# Altium schematic symbol library 724452_RPL-HX_Mobile_AEP_Rev0p91_Library.SchLib: 162 symbols (part 3 of 5) (continued)
## C_SLG7NT44244 (continued)

## C_SLG7NT44603
designator ?  (value not drawn)
CDS_LMAN_SYM_OUTLINE: -500,550,500,-550; ROOM: NONE; OriginalSymbolOrigin: (-550,550); FP_TECH: ?; IP: ?; MATERIAL: ?; PACK_TYPE: ?; PART_NUMBER: ?; VARIANT: ?
pins: 1 VDD (power) hidden to VDD, 2 BC_ACOK_IN (in), 3 DPWROK (out), 4 BC_ACOK_DSW (out), 5 SUS_VR_PWRGD (in), 6 V1 (io), 7 PWRBTN_N (in), 8 VCCST_PWRGD (out), 9 EC_RTC_WAKE_N (in), 10 V2 (io), 11 GND (in), 12 V3P3_DSW_VR_EN (out), 13 V3 (io), 14 EC_DS3 (in), 15 VBAT_MON (io), 16 RSMRST_PWRGD_N (out), 17 V3P3DSW_PWRGD (in), 18 ALL_SYS_PWRGD (out), 19 VCCINAUX_PG_DDR_V (in), 20 PCH_PWROK (out)

## C_SN74CBT3125
designator ?  (value not drawn)
CDS_LMAN_SYM_OUTLINE: -250,450,250,-450; ROOM: NONE; OriginalSymbolOrigin: (-300,450); FP_TECH: ?; IP: ?; MATERIAL: ?; PACK_TYPE: ?; PART_NUMBER: ?; VARIANT: ?
pins: 1 1OE_N (in), 2 1A (in), 3 1B (out), 4 2OE_N (in), 5 2A (in), 6 2B (out), 7 GND (in), 8 3B (out), 9 3A (in), 10 3OE_N (in), 11 4B (out), 12 4A (in), 13 4OE_N (in), 14 VCC (power), 15 THPAD (in)

## C_SN74CBTLV3257
designator ?  (value not drawn)
CDS_LMAN_SYM_OUTLINE: -200,450,200,-450; ROOM: NONE; OriginalSymbolOrigin: (-250,450); FP_TECH: ?; IP: ?; MATERIAL: ?; PACK_TYPE: ?; PART_NUMBER: ?; VARIANT: ?
pins: 1 S (in), 2 1B1 (io), 3 1B2 (io), 4 1A (io), 5 2B1 (io), 6 2B2 (io), 7 2A (io), 8 GND (in), 9 3A (io), 10 3B2 (io), 11 3B1 (io), 12 4A (io), 13 4B2 (io), 14 4B1 (io), 15 OE_N (in), 16 VCC (power) hidden to VCC

## C_SW_SPST_PB_4P
designator ?  (value not drawn)
CDS_LMAN_SYM_OUTLINE: -150,200,150,-200; ROOM: NONE; OriginalSymbolOrigin: (-175,200); FP_TECH: ?; IP: ?; MATERIAL: ?; PACK_TYPE: ?; PART_NUMBER: ?; VARIANT: ?
pins: 1 (io), 2 (io), 3 (io), 4 (io)

## C_THERMISTOR
designator ?, comment ?
CDS_LMAN_SYM_OUTLINE: -50,50,50,-50; ROOM: NONE; OriginalSymbolOrigin: (-75,50); FP_TECH: ?; IP: ?; MATERIAL: ?; PACK_TYPE: ?; PART_NUMBER: ?; TOLERANCE: ?; VARIANT: ?; WATTAGE: ?
pins: 1 A (io), 2 B (io)

## C_TLV62585
designator ?  (value not drawn)
CDS_LMAN_SYM_OUTLINE: -200,200,200,-200; ROOM: NONE; OriginalSymbolOrigin: (-225,200); FP_TECH: ?; IP: ?; MATERIAL: ?; PACK_TYPE: ?; PART_NUMBER: ?; VARIANT: ?
pins: 1 GND (in), 2 SW (out), 3 VIN (power), 4 EN (in), 5 FB (io), 6 NC (io)

## C_TS3A27518E
designator ?  (value not drawn)
6 Circuit IC Switch 2:1 6.2Ohm 24-WQFN (4x4); Manufacturer Part Number: TS3A27518ERTWR; Case/Package: 24-WFQFN
pins: 1 COM1, 2 GND, 3 COM2, 4 COM3, 5 VCC, 6 COM4, 7 COM5, 8 NO1, 9 COM6, 10 NO2, 11 IN2, 12 NO3, 13 NO6, 14 NO4, 15 NO5, 16 NC5, 17 EN_N, 18 NC4, 19 NC6, 20 NC3, 21 IN1, 22 NC2, 23 NC1, 24 NC, 25 THPAD

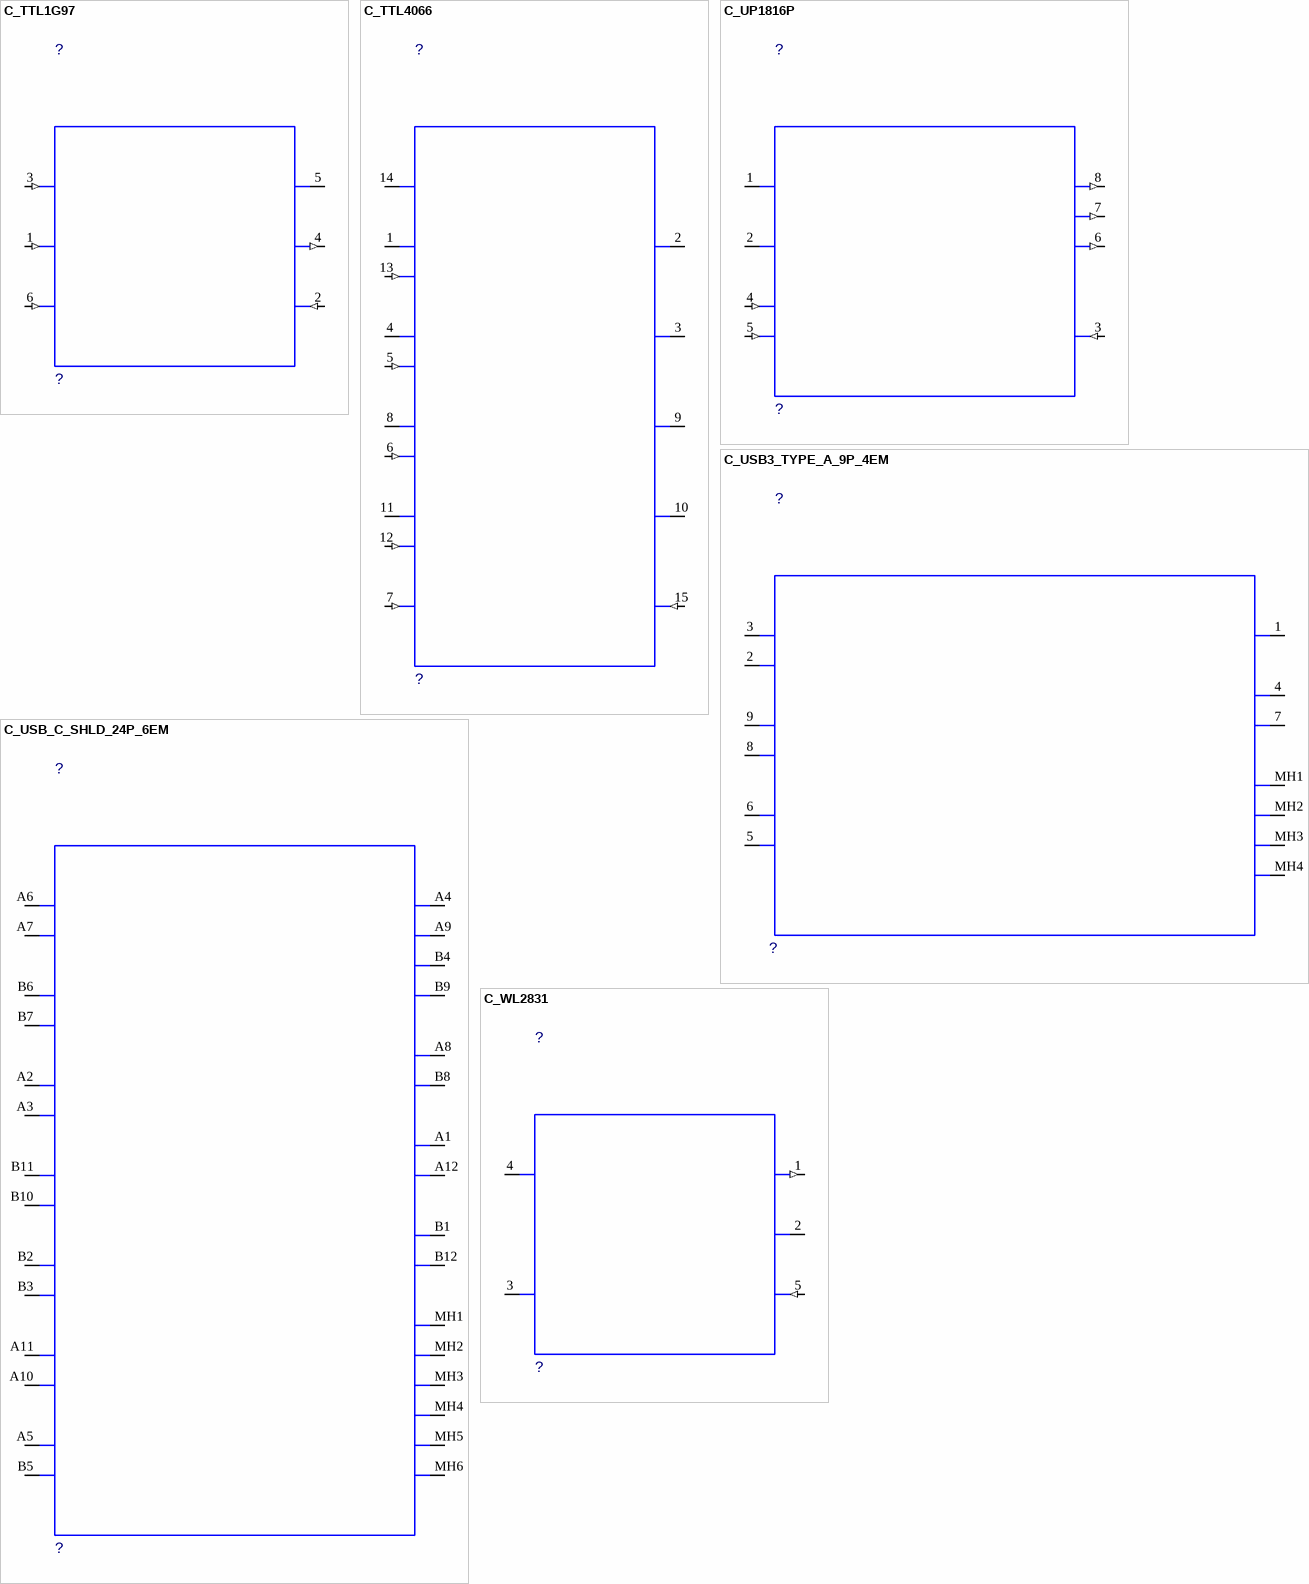
[diagram p25: symbols C_TTL1G97 to C_WL2831]

## C_TTL1G97
designator ?  (value not drawn)
CDS_LMAN_SYM_OUTLINE: -200,200,200,-200; ROOM: NONE; OriginalSymbolOrigin: (-225,200); FP_TECH: ?; IP: ?; MATERIAL: ?; PACK_TYPE: ?; PART_NUMBER: ?; VARIANT: ?
pins: 1 B (in), 2 GND (in), 3 A (in), 4 Y (out), 5 VCC (power), 6 C (in)

## C_TTL4066
designator ?  (value not drawn)
CDS_LMAN_SYM_OUTLINE: -200,450,200,-450; ROOM: NONE; OriginalSymbolOrigin: (-225,450); FP_TECH: ?; IP: ?; MATERIAL: ?; PACK_TYPE: ?; PART_NUMBER: ?; VARIANT: ?
pins: 1 1Y (io), 2 1Z (io), 3 2Z (io), 4 2Y (io), 5 2E (in), 6 3E (in), 7 GND (in), 8 3Y (io), 9 3Z (io), 10 4Z (io), 11 4Y (io), 12 4E (in), 13 1E (in), 14 VCC (power), 15 GND_TPD (in)

## C_UP1816P
designator ?  (value not drawn)
CDS_LMAN_SYM_OUTLINE: -250,200,250,-250; ROOM: NONE; OriginalSymbolOrigin: (-275,200); FP_TECH: ?; IP: ?; MATERIAL: ?; PACK_TYPE: ?; PART_NUMBER: ?; VARIANT: ?
pins: 1 VCC (power), 2 BUS_SEL (io), 3 GND (in), 4 SDA (in), 5 SCL (in), 6 OUT3 (out), 7 OUT2 (out), 8 OUT1 (out)

## C_USB3_TYPE_A_9P_4EM
designator ?  (value not drawn)
CDS_LMAN_SYM_OUTLINE: -400,300,400,-300; ROOM: NONE; OriginalSymbolOrigin: (-425,300); FP_TECH: ?; IP: ?; MATERIAL: ?; PACK_TYPE: ?; PART_NUMBER: ?; VARIANT: ?
pins: 1 VBUS_POWER (power), 2 D_DN (io), 3 D_DP (io), 4 GND_POWER_RETURN (io), 5 SSRX_DN (io), 6 SSRX_DP (io), 7 GND (io), 8 SSTX_DN (io), 9 SSTX_DP (io), MH1 (io), MH2 (io), MH3 (io), MH4 (io)

## C_USB_C_SHLD_24P_6EM
designator ?  (value not drawn)
CDS_LMAN_SYM_OUTLINE: -300,600,300,-550; ROOM: NONE; OriginalSymbolOrigin: (-325,600); FP_TECH: ?; IP: ?; MATERIAL: ?; PACK_TYPE: ?; PART_NUMBER: ?; VARIANT: ?
pins: A1 GND_A1 (io), A2 SSTXP1 (io), A3 SSTXN1 (io), A4 VBUS_A4 (power), A5 CC1 (io), A6 DP1 (io), A7 DN1 (io), A8 SBU1 (io), A9 VBUS_A9 (power), A10 SSRXN2 (io), A11 SSRXP2 (io), A12 GND_A12 (io), B1 GND_B1 (io), B2 SSTXP2 (io), B3 SSTXN2 (io), B4 VBUS_B4 (power), B5 CC2 (io), B6 DP2 (io), B7 DN2 (io), B8 SBU2 (io), B9 VBUS_B9 (power), B10 SSRXN1 (io), B11 SSRXP1 (io), B12 GND_B12 (io), MH1 (io), MH2 (io), MH3 (io), MH4 (io), MH5 (io), MH6 (io)

## C_WL2831
designator ?  (value not drawn)
CDS_LMAN_SYM_OUTLINE: -200,200,200,-200; ROOM: NONE; OriginalSymbolOrigin: (-225,200); FP_TECH: ?; IP: ?; MATERIAL: ?; PACK_TYPE: ?; PART_NUMBER: ?; VARIANT: ?
pins: 1 VOUT (out), 2 BIAS (io), 3 EN (io), 4 VIN (power), 5 GND_TPD (in)

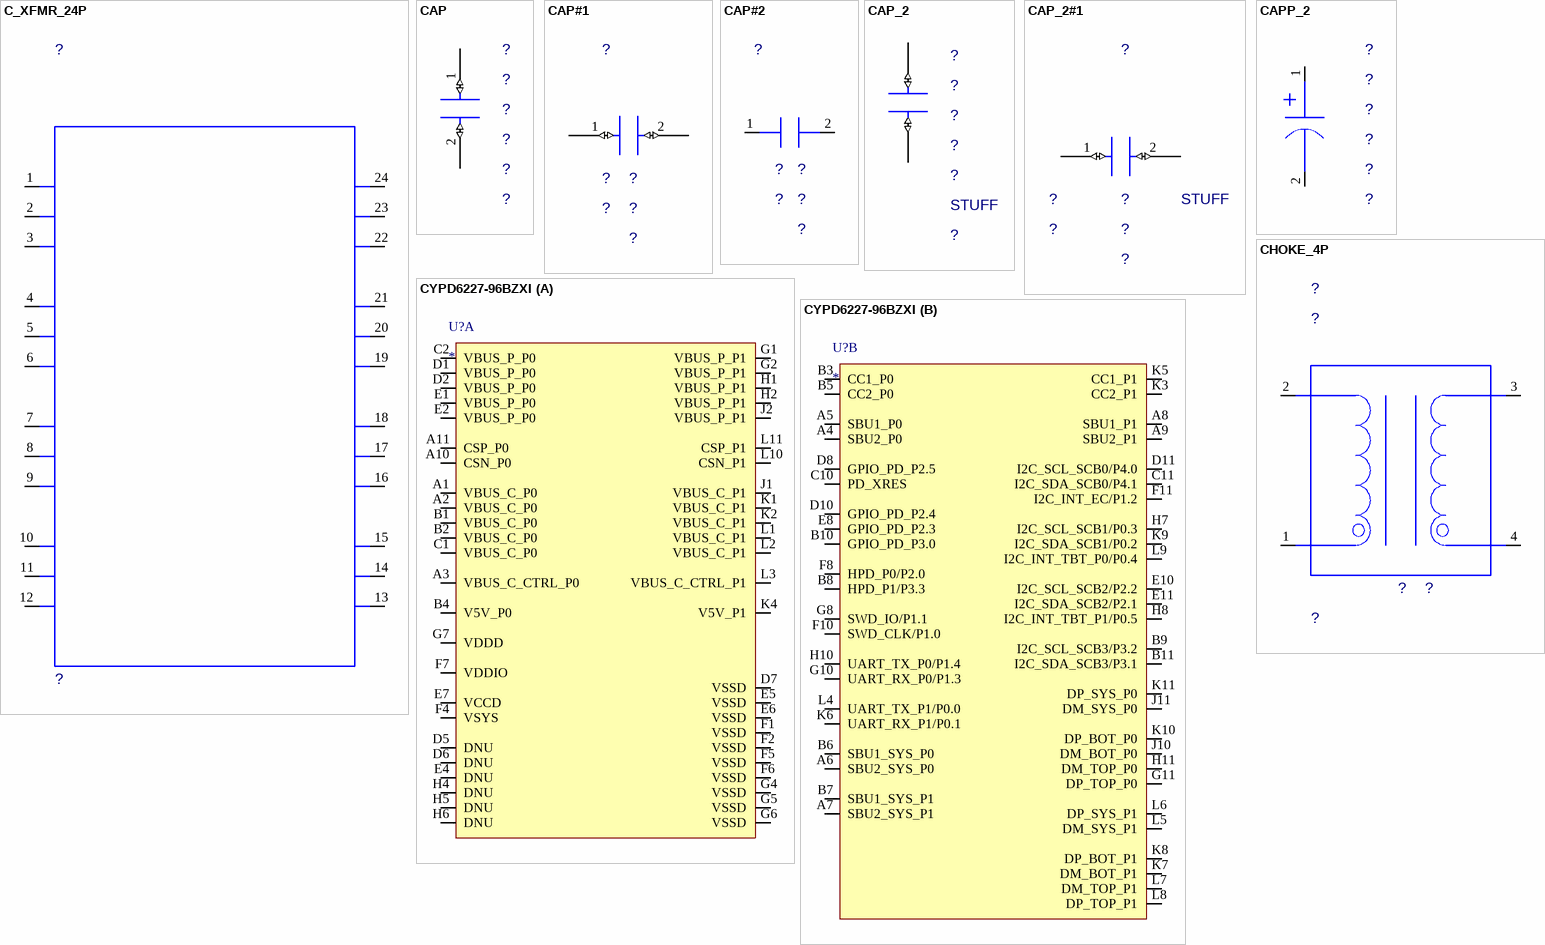
[diagram p26: symbols C_XFMR_24P to CYPD6227-96BZXI]

## C_XFMR_24P
designator ?  (value not drawn)
CDS_LMAN_SYM_OUTLINE: -250,450,250,-450; ROOM: NONE; OriginalSymbolOrigin: (-275,450); FP_TECH: ?; IP: ?; MATERIAL: ?; PACK_TYPE: ?; PART_NUMBER: ?; VARIANT: ?
pins: 1 TCT1 (io), 2 TD1P (io), 3 TD1N (io), 4 TCT2 (io), 5 TD2P (io), 6 TD2N (io), 7 TCT3 (io), 8 TD3P (io), 9 TD3N (io), 10 TCT4 (io), 11 TD4P (io), 12 TD4N (io), 13 MX4N (io), 14 MX4P (io), 15 MCT4 (io), 16 MX3N (io), 17 MX3P (io), 18 MCT3 (io), 19 MX2N (io), 20 MX2P (io), 21 MCT2 (io), 22 MX1N (io), 23 MX1P (io), 24 MCT1 (io)

## CAP
designator ?, comment ?
OriginalSymbolOrigin: (-50,25); MATERIAL: ?; PACK_TYPE: ?; PART_NUMBER: ?; TOLERANCE: ?; VOLTAGE: ?
pins: 1 A (io), 2 B (io)

## CAP#1
designator ?, comment ?
OriginalSymbolOrigin: (-25,50); MATERIAL: ?; PACK_TYPE: ?; PART_NUMBER: ?; TOLERANCE: ?; VOLTAGE: ?
pins: 1 A (io), 2 B (io)

## CAP#2
designator ?, comment ?
OriginalSymbolOrigin: (-75,25); MATERIAL: ?; PACK_TYPE: ?; PART_NUMBER: ?; TOLERANCE: ?; VOLTAGE: ?
pins: 1 A (io), 2 B (io)

## CAP_2
designator ?, comment ?  BOM_USE: STUFF
CDS_LMAN_SYM_OUTLINE: -50,50,50,-50; ROOM: NONE; OriginalSymbolOrigin: (-50,25); FP_TECH: ?; IP: ?; MATERIAL: ?; PACK_TYPE: ?; PART_NUMBER: ?; TOLERANCE: ?; VARIANT: ?; VOLTAGE: ?
pins: 1 A (io), 2 B (io)

## CAP_2#1
designator ?, comment ?  BOM_USE: STUFF
CDS_LMAN_SYM_OUTLINE: -50,50,50,-50; ROOM: NONE; OriginalSymbolOrigin: (-25,50); FP_TECH: ?; IP: ?; MATERIAL: ?; PACK_TYPE: ?; PART_NUMBER: ?; TOLERANCE: ?; VARIANT: ?; VOLTAGE: ?
pins: 1 A (io), 2 B (io)

## CAPP_2
designator ?, comment ?
BOM_USE: STUFF; CDS_LMAN_SYM_OUTLINE: -50,100,50,-50; ROOM: NONE; OriginalSymbolOrigin: (-50,75); FP_TECH: ?; IP: ?; MATERIAL: ?; PACK_TYPE: ?; PART_NUMBER: ?; TOLERANCE: ?; VARIANT: ?; VOLTAGE: ?
pins: 1 A (io), 2 B (io)

## CHOKE_4P
designator ?, comment ?
CDS_LMAN_SYM_OUTLINE: -150,200,150,-150; OriginalSymbolOrigin: (-175,200); CURRENT: ?; MATERIAL: ?; PACK_TYPE: ?; PART_NUMBER: ?; TOLERANCE: ?
pins: 1 PIN1 (io), 2 PIN2 (io), 3 PIN3 (io), 4 PIN4 (io)

## CYPD6227-96BZXI
designator U?
part A pins: A1 VBUS_C_P0, A2 VBUS_C_P0, A3 VBUS_C_CTRL_P0, A10 CSN_P0, A11 CSP_P0, B1 VBUS_C_P0, B2 VBUS_C_P0, B4 V5V_P0, C1 VBUS_C_P0, C2 VBUS_P_P0, D1 VBUS_P_P0, D2 VBUS_P_P0, D5 DNU, D6 DNU, D7 VSSD, E1 VBUS_P_P0, E2 VBUS_P_P0, E4 DNU, E5 VSSD, E6 VSSD, E7 VCCD, F1 VSSD, F2 VSSD, F4 VSYS, F5 VSSD, F6 VSSD, F7 VDDIO, G1 VBUS_P_P1, G2 VBUS_P_P1, G4 VSSD, G5 VSSD, G6 VSSD, G7 VDDD, H1 VBUS_P_P1, H2 VBUS_P_P1, H4 DNU, H5 DNU, H6 DNU, J1 VBUS_C_P1, J2 VBUS_P_P1, K1 VBUS_C_P1, K2 VBUS_C_P1, K4 V5V_P1, L1 VBUS_C_P1, L2 VBUS_C_P1, L3 VBUS_C_CTRL_P1, L10 CSN_P1, L11 CSP_P1
part B pins: A4 SBU2_P0, A5 SBU1_P0, A6 SBU2_SYS_P0, A7 SBU2_SYS_P1, A8 SBU1_P1, A9 SBU2_P1, B3 CC1_P0, B5 CC2_P0, B6 SBU1_SYS_P0, B7 SBU1_SYS_P1, B8 HPD_P1/P3.3, B9 I2C_SCL_SCB3/P3.2, B10 GPIO_PD_P3.0, B11 I2C_SDA_SCB3/P3.1, C10 PD_XRES, C11 I2C_SDA_SCB0/P4.1, D8 GPIO_PD_P2.5, D10 GPIO_PD_P2.4, D11 I2C_SCL_SCB0/P4.0, E8 GPIO_PD_P2.3, E10 I2C_SCL_SCB2/P2.2, E11 I2C_SDA_SCB2/P2.1, F8 HPD_P0/P2.0, F10 SWD_CLK/P1.0, F11 I2C_INT_EC/P1.2, G8 SWD_IO/P1.1, G10 UART_RX_P0/P1.3, G11 DP_TOP_P0, H7 I2C_SCL_SCB1/P0.3, H8 I2C_INT_TBT_P1/P0.5, H10 UART_TX_P0/P1.4, H11 DM_TOP_P0, J10 DM_BOT_P0, J11 DM_SYS_P0, K3 CC2_P1, K5 CC1_P1, K6 UART_RX_P1/P0.1, K7 DM_BOT_P1, K8 DP_BOT_P1, K9 I2C_SDA_SCB1/P0.2, K10 DP_BOT_P0, K11 DP_SYS_P0, L4 UART_TX_P1/P0.0, L5 DM_SYS_P1, L6 DP_SYS_P1, L7 DM_TOP_P1, L8 DP_TOP_P1, L9 I2C_INT_TBT_P0/P0.4

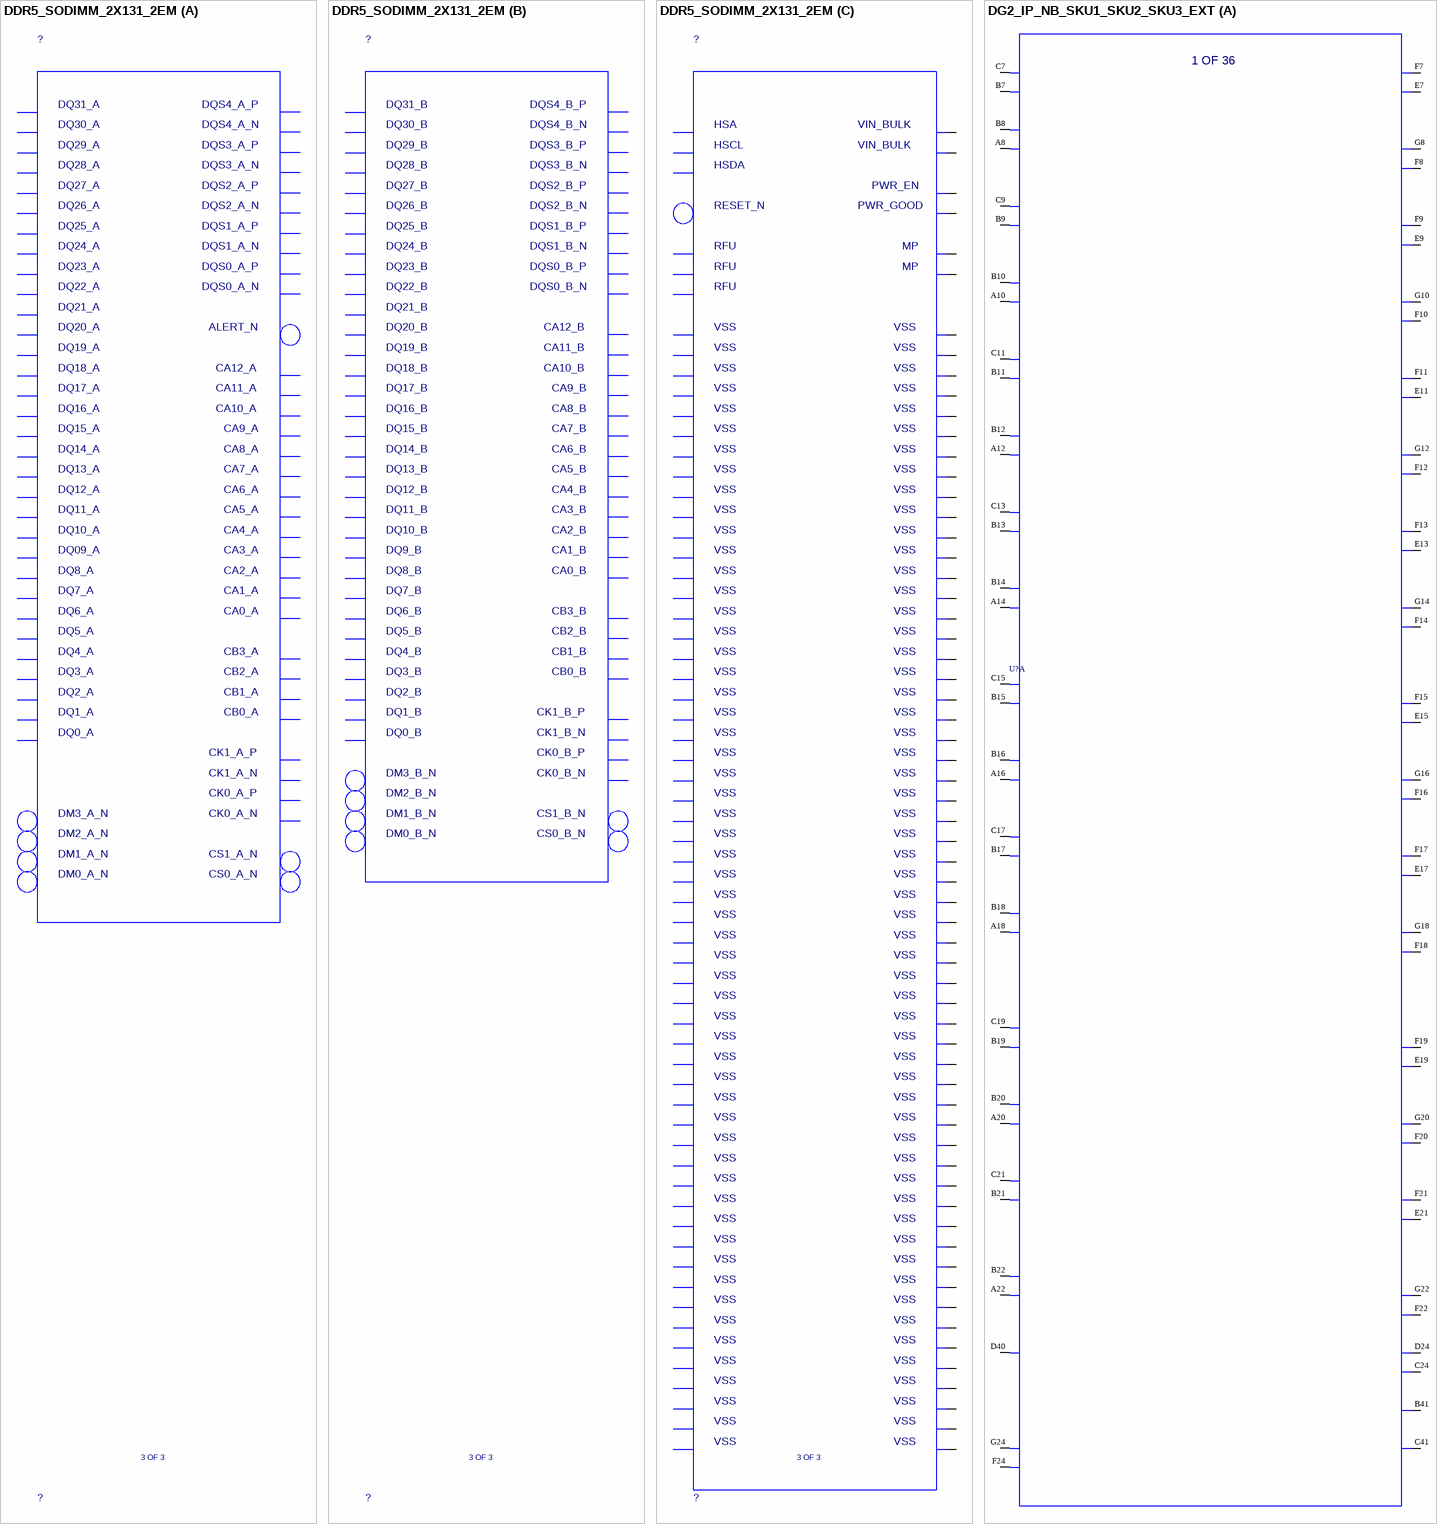
[diagram p27: symbols DDR5_SODIMM_2X131_2EM to DG2_IP_NB_SKU1_SKU2_SKU3_EXT]

## DDR5_SODIMM_2X131_2EM
designator ?  PART_SYM_NUM: 3 OF 3  (hidden comment: DDR5_SODIMM_2X131_2EM)
BOM_USE: STUFF; ROOM: NONE; OriginalSymbolOrigin: (-350,1750); FP_TECH: ?; IP: ?; MATERIAL: ?; PACK_TYPE: ?; PART_NUMBER: ?; VARIANT: ?
part A pins: 11 DQ0_A (io), 12 DQ1_A (io), 15 DQ2_A (io), 16 DQ3_A (io), 19 DM0_A_N (io), 20 DQS0_AN (io), 22 DQS0_A_P (io), 23 DQ4_A (io), 26 DQ5_A (io), 27 DQ6_A (io), 30 DQ7_A (io), 31 DQ8_A (io), 34 DQ09_A (io), 35 DQ10_A (io), 38 DQ11_A (io), 39 DQS1_AN (io), 41 DQS1_A_P (io), 42 DM1_A_N (io), 45 DQ12_A (io), 46 DQ13_A (io), 49 DQ14_A (io), 50 DQ15_A (io), 53 DQ16_A (io), 54 DQ17_A (io), 57 DQ18_A (io), 58 DQ19_A (io), 61 DM2_A_N (io), 62 DQS2_AN (io), 64 DQS2_A_P (io), 65 DQ20_A (io), 68 DQ21_A (io), 69 DQ22_A (io), 72 DQ23_A (io), 73 DQ24_A (io), 76 DQ25_A (io), 77 DQ26_A (io), 80 DQ27_A (io), 81 DQS3_AN (io), 83 DQS3_A_P (io), 84 DM3_A_N (io), 87 DQ28_A (io), 88 DQ29_A (io), 91 DQ30_A (io), 92 DQ31_A (io), 95 CB0_A (io), 96 CB1_A (io), 99 CB2_A (io), 100 DQS4_AN (io), 102 DQS4_A_P (io), 103 CB3_A (io), 106 CS0_A_N (io), 107 CA0_A (io), 108 ALERT_N (io), 109 CA1_A (io), 110 CS1_A_N (io), 113 CA2_A (io), 114 CA3_A (io), 115 CA4_A (io), 116 CA5_A (io), 119 CA6_A (io), 120 CA7_A (io), 121 CA8_A (io), 122 CA9_A (io), 125 CA10_A (io), 126 CA11_A (io), 127 CA12_A (io), 131 CK0_A_P (io), 132 CK1_A_P (io), 133 CK0_AN (io), 134 CK1_AN (io)
part B pins: 137 CK0_B_P (io), 138 CK1_B_P (io), 139 CK0_BN (io), 140 CK1_BN (io), 144 CA12_B (io), 145 CA11_B (io), 146 CA10_B (io), 149 CA9_B (io), 150 CA8_B (io), 151 CA7_B (io), 152 CA6_B (io), 155 CA5_B (io), 156 CA4_B (io), 157 CA3_B (io), 158 CA2_B (io), 161 CS0_B_N (io), 162 CA1_B (io), 164 CA0_B (io), 165 CS1_B_N (io), 168 CB0_B (io), 169 DQS4_BN (io), 171 DQS4_B_P (io), 172 CB1_B (io), 175 CB3_B (io), 176 CB2_B (io), 179 DQ0_B (io), 180 DQ1_B (io), 183 DQ2_B (io), 184 DQ3_B (io), 187 DM0_B_N (io), 188 DQS0_BN (io), 190 DQS0_B_P (io), 191 DQ4_B (io), 194 DQ5_B (io), 195 DQ6_B (io), 198 DQ7_B (io), 199 DQ8_B (io), 202 DQ9_B (io), 203 DQ10_B (io), 206 DQ11_B (io), 207 DQS1_BN (io), 209 DQS1_B_P (io), 210 DM1_B_N (io), 213 DQ12_B (io), 214 DQ13_B (io), 217 DQ14_B (io), 218 DQ15_B (io), 221 DQ16_B (io), 222 DQ17_B (io), 225 DQ18_B (io), 226 DQ19_B (io), 229 DM2_B_N (io), 230 DQS2_BN (io), 232 DQS2_B_P (io), 233 DQ20_B (io), 236 DQ21_B (io), 237 DQ22_B (io), 240 DQ23_B (io), 241 DQ24_B (io), 244 DQ25_B (io), 245 DQ26_B (io), 248 DQ27_B (io), 249 DQS3_BN (io), 251 DQS3_B_P (io), 252 DM3_B_N (io), 255 DQ28_B (io), 256 DQ29_B (io), 259 DQ30_B (io), 260 DQ31_B (io)
part C pins: 1 VIN_BULK_1 (io), 2 HSA (io), 3 VIN_BULK_3 (io), 4 HSCL (io), 5 RFU_5 (io), 6 HSDA (io), 7 PWR_GOOD (io), 8 PWR_EN (io), 9 VSS_9 (io), 10 VSS_10 (io), 13 VSS_13 (io), 14 VSS_14 (io), 17 VSS_17 (io), 18 VSS_18 (io), 21 VSS_21 (io), 24 VSS_24 (io), 25 VSS_25 (io), 28 VSS_28 (io), 29 VSS_29 (io), 32 VSS_32 (io), 33 VSS_33 (io), 36 VSS_36 (io), 37 VSS_37 (io), 40 VSS_40 (io), 43 VSS_43 (io), 44 VSS_44 (io), 47 VSS_47 (io), 48 VSS_48 (io), 51 VSS_51 (io), 52 VSS_52 (io), 55 VSS_55 (io), 56 VSS_56 (io), 59 VSS_59 (io), 60 VSS_60 (io), 63 VSS_63 (io), 66 VSS_66 (io), 67 VSS_67 (io), 70 VSS_70 (io), 71 VSS_71 (io), 74 VSS_74 (io), 75 VSS_75 (io), 78 VSS_78 (io), 79 VSS_79 (io), 82 VSS_82 (io), 85 VSS_85 (io), 86 VSS_86 (io), 89 VSS_89 (io), 90 VSS_90 (io), 93 VSS_93 (io), 94 VSS_94 (io), 97 VSS_97 (io), 98 VSS_98 (io), 101 VSS_101 (io), 104 VSS_104 (io), 105 VSS_105 (io), 111 VSS_111 (io), 112 VSS_112 (io), 117 VSS_117 (io), 118 VSS_118 (io), 123 VSS_123 (io), 124 VSS_124 (io), 128 RFU_128 (io), 129 VSS_129 (io), 130 VSS_130 (io), 135 VSS_135 (io), 136 VSS_136 (io), 141 VSS_141 (io), 142 VSS_142 (io), 143 RFU_143 (io), 147 VSS_147 (io), 148 VSS_148 (io), 153 VSS_153 (io), 154 VSS_154 (io), 159 VSS_159 (io), 160 VSS_160 (io), 163 RESET_N (io), 166 VSS_166 (io), 167 VSS_167 (io), 170 VSS_170 (io), 173 VSS_173 (io), 174 VSS_174 (io), 177 VSS_177 (io), 178 VSS_178 (io), 181 VSS_181 (io), 182 VSS_182 (io), 185 VSS_185 (io), 186 VSS_186 (io), 189 VSS_189 (io), 192 VSS_192 (io), 193 VSS_193 (io), 196 VSS_196 (io), 197 VSS_197 (io), 200 VSS_200 (io), 201 VSS_201 (io), 204 VSS_204 (io), 205 VSS_205 (io), 208 VSS_208 (io), 211 VSS_211 (io), 212 VSS_212 (io), 215 VSS_215 (io), 216 VSS_216 (io), 219 VSS_219 (io), 220 VSS_220 (io), 223 VSS_223 (io), 224 VSS_224 (io), 227 VSS_227 (io), 228 VSS_228 (io), 231 VSS_231 (io), 234 VSS_234 (io), 235 VSS_235 (io), 238 VSS_238 (io), 239 VSS_239 (io), 242 VSS_242 (io), 243 VSS_243 (io), 246 VSS_246 (io), 247 VSS_247 (io), 250 VSS_250 (io), 253 VSS_253 (io), 254 VSS_254 (io), 257 VSS_257 (io), 258 VSS_258 (io), 261 VSS_261 (io), 262 VSS_262 (io), MP1 (io), MP2 (io)

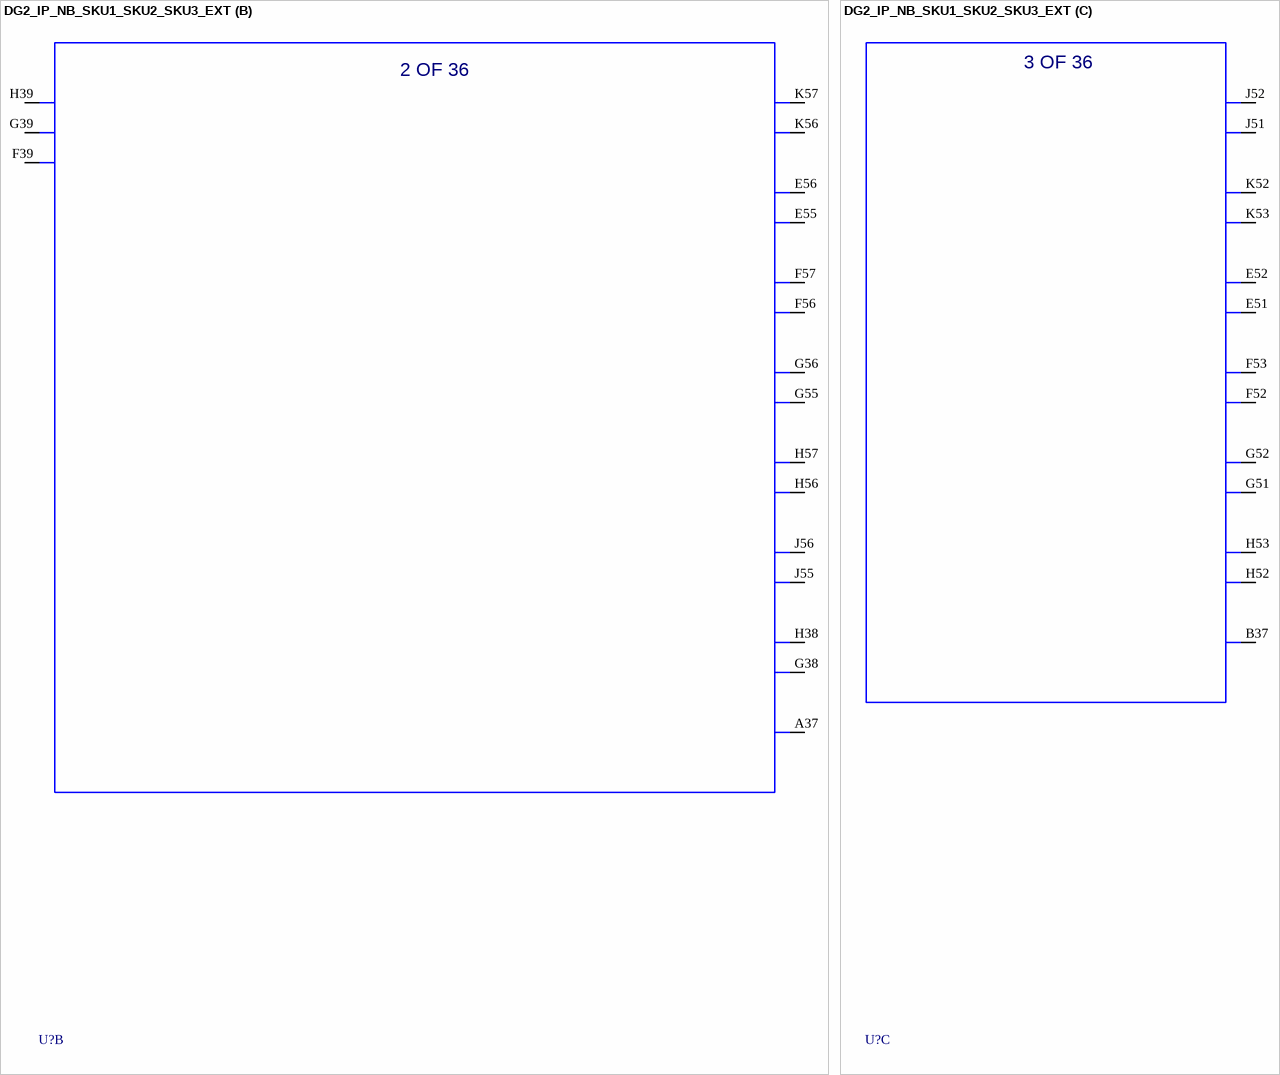
[diagram p28: symbol DG2_IP_NB_SKU1_SKU2_SKU3_EXT]

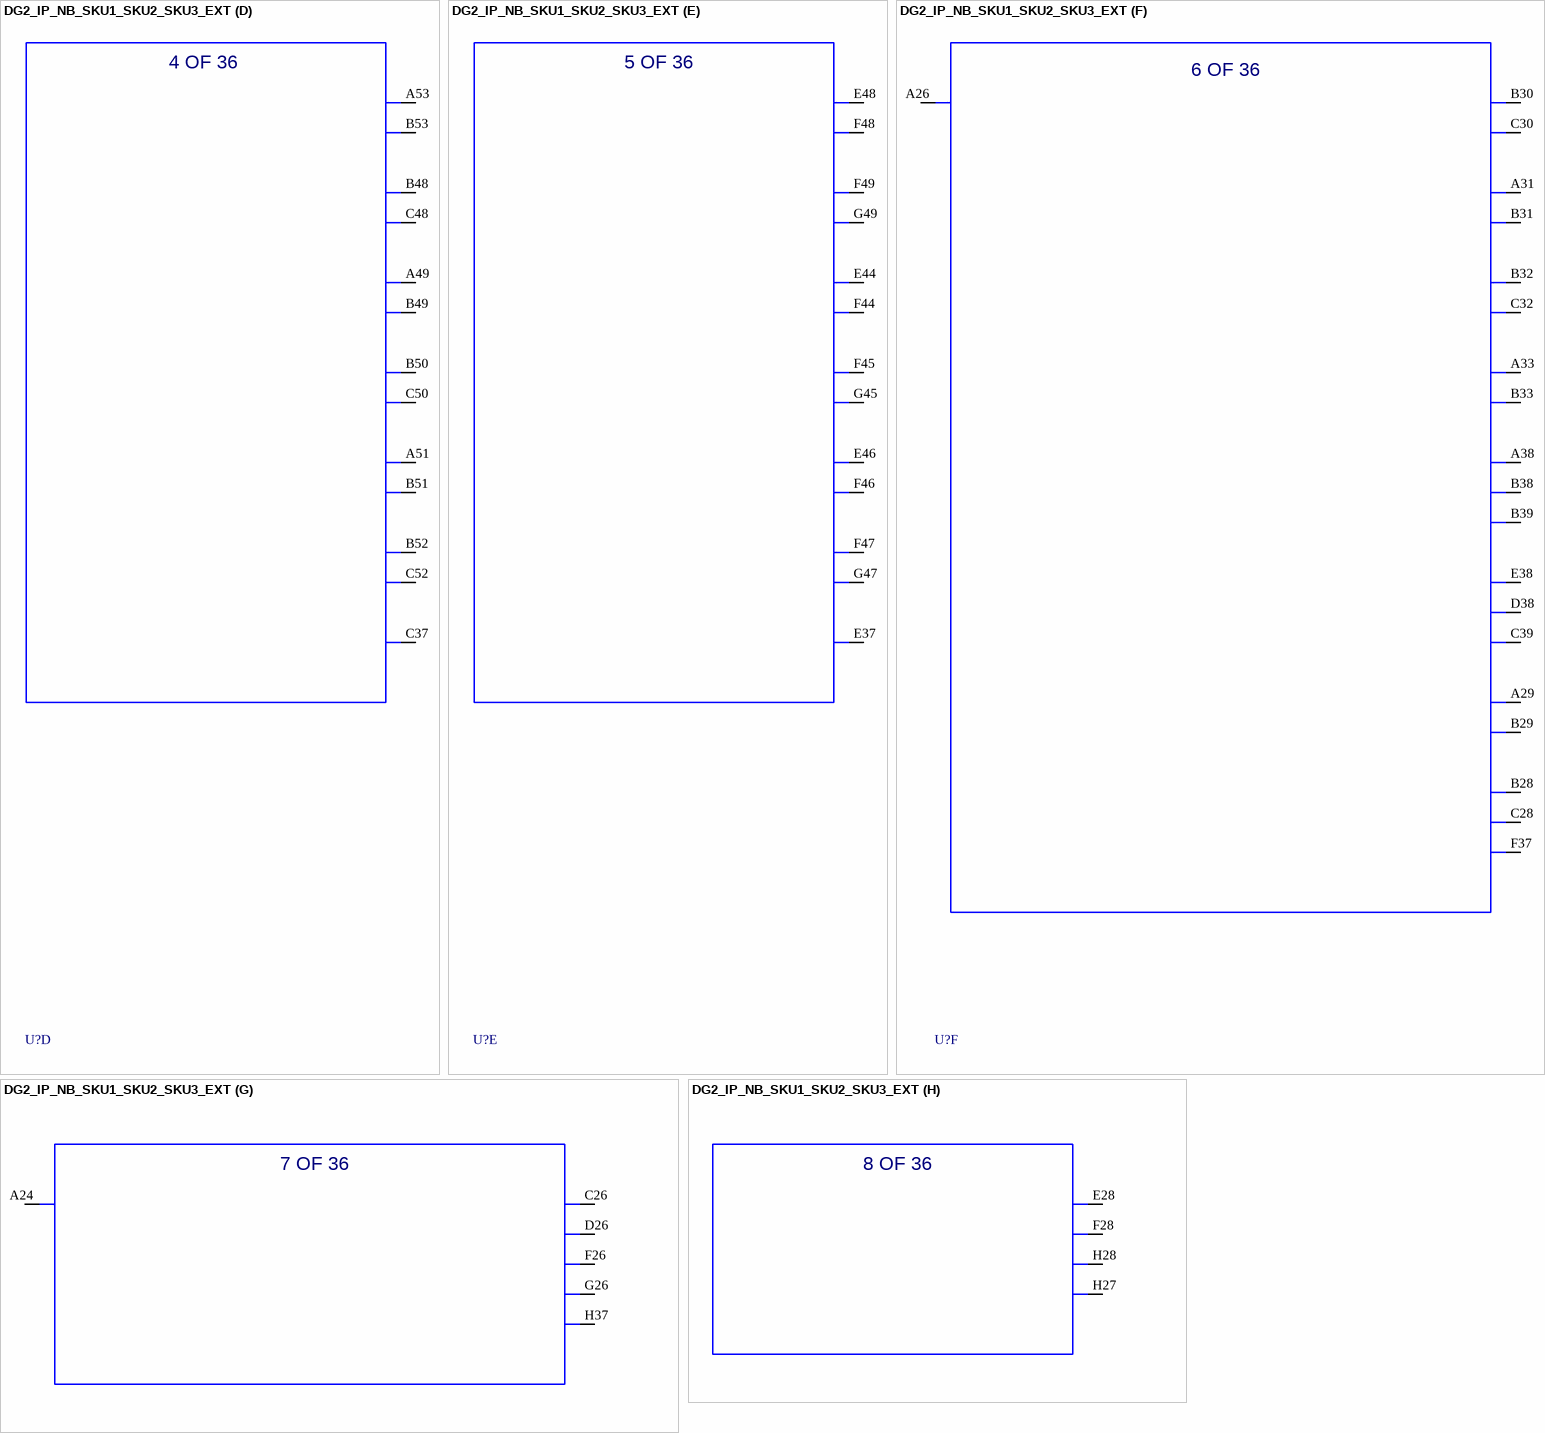
[diagram p29: symbol DG2_IP_NB_SKU1_SKU2_SKU3_EXT]
